# Altium footprint library PcbLib1.PcbLib: 41 footprints (part 1 of 3)
Each footprint in its own frame and in the unit in brackets; x right, y up, seen from the top. Pads: shape width x height; smd on the part's side, far side on the other; paste and mask are expansions set on the pad; w line width, h text height; cw(c..) or ccw(c..) is an arc to the next point about the centre after c.
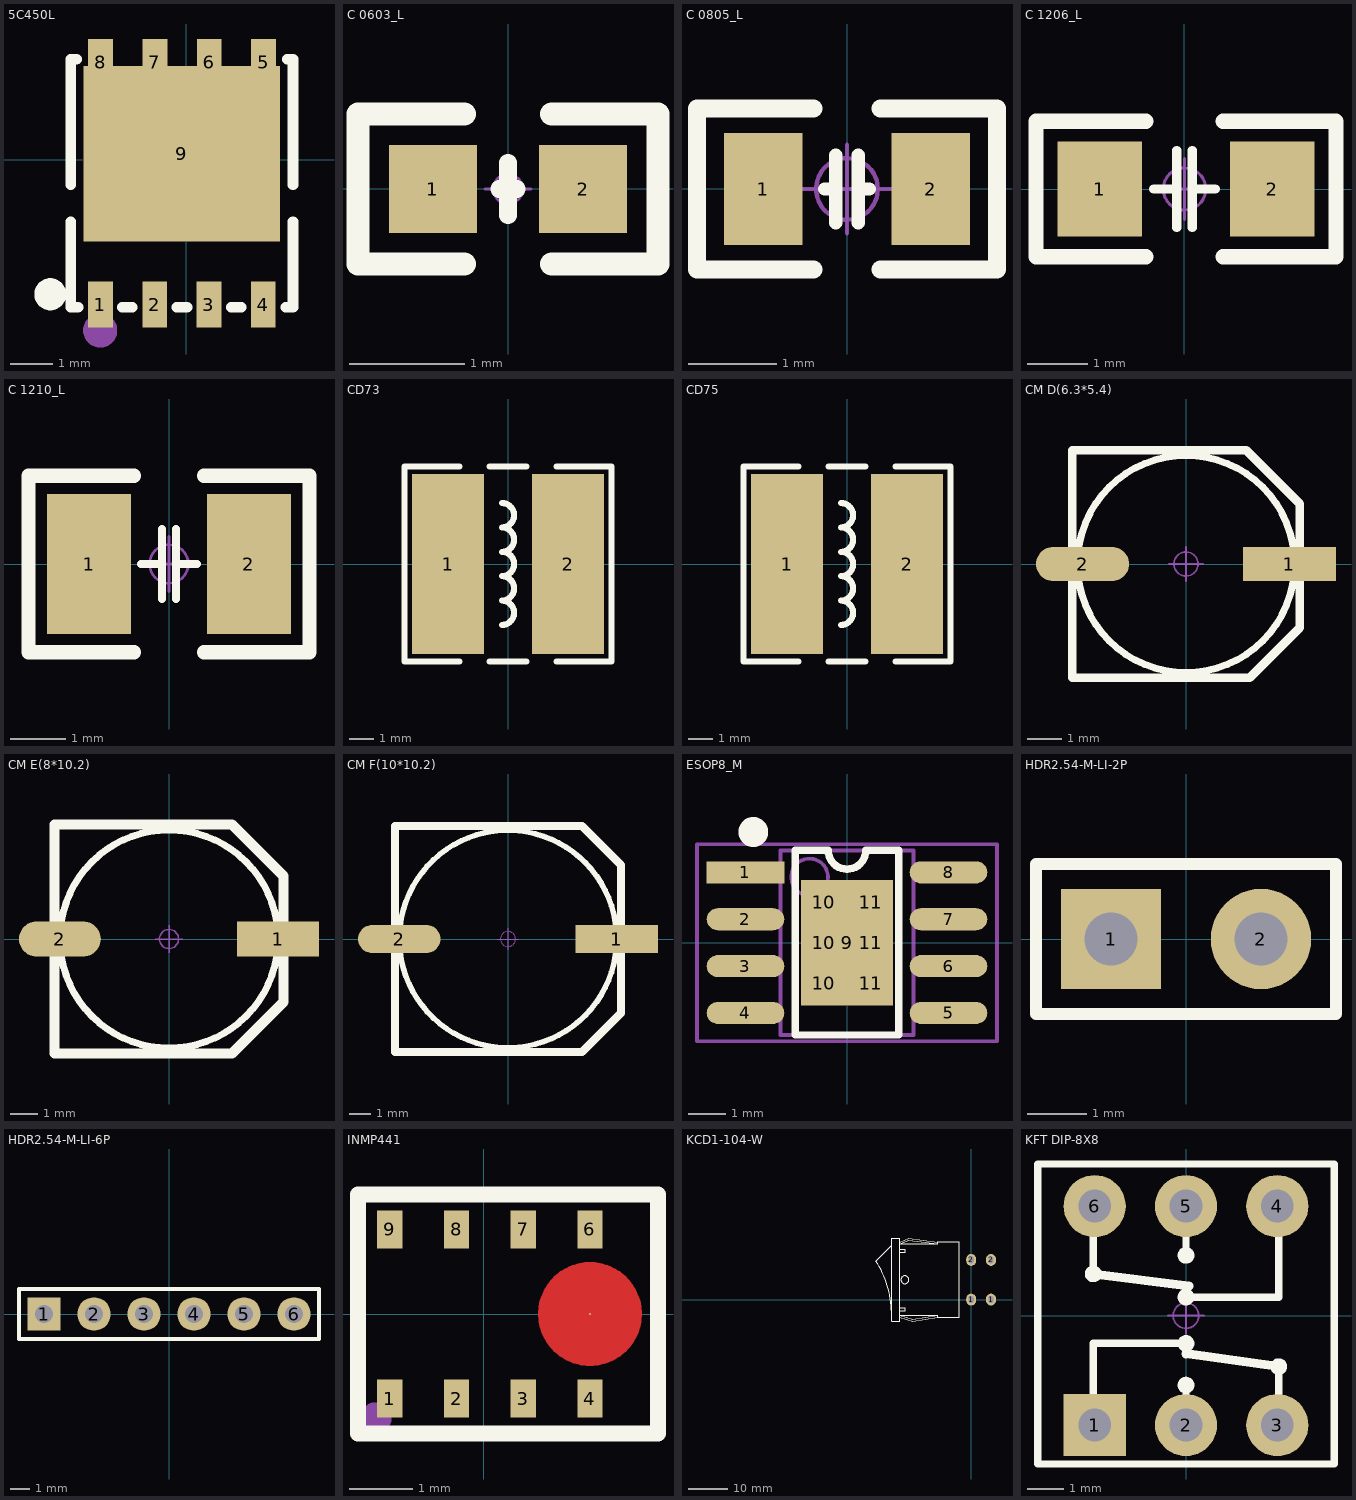
[diagram p0: the footprints below, top view; thin cyan lines are the x and y axes]

## 5C450L [mm]
pads (9):
  rect 0.58x1.079 smd paste-100 mask+0.05: 1(-2.007,-3.386) 2(-0.737,-3.386) 3(0.533,-3.386) 4(1.803,-3.386)
  rect 0.58x1.08 smd paste-100 mask+0.05: 5(1.808,2.283) 6(0.538,2.283) 7(-0.732,2.283) 8(-2.002,2.283)
  rect 4.6x4.1 smd paste-100 mask+0.05: 9(-0.102,0.144)
Top Overlay:
  lines w0.25: -2.702,-1.448 -2.702,-3.446 -2.531,-3.446 ; -2.702,-0.584 -2.702,2.354 -2.565,2.354 -2.602,2.354 ; -1.493,-3.446 -1.261,-3.446 ; -0.223,-3.446 0.019,-3.446 ; 1.057,-3.446 1.289,-3.446 ; 2.327,-3.446 2.498,-3.446 2.498,-1.448 ; 2.398,2.354 2.361,2.354 2.498,2.354 2.498,-0.584
  lines w0.5: -3.302,-3.146 ccw(c-3.178,-3.145) -3.302,-3.144
Top Paste:
  region: -2.302,-2.841 -1.712,-2.841 -1.712,-3.931 -2.302,-3.931
  region: -1.032,-2.841 -0.442,-2.841 -0.442,-3.931 -1.032,-3.931
  region: 0.238,-2.841 0.828,-2.841 0.828,-3.931 0.238,-3.931
  region: 1.508,-2.841 2.098,-2.841 2.098,-3.931 1.508,-3.931
  region: -2.292,2.823 -1.713,2.823 -1.713,2.193 -1.023,2.193 -1.023,2.823 -0.443,2.823 -0.443,2.193 0.248,2.193 0.248,2.824 0.828,2.824 0.828,2.194 1.518,2.194 1.518,2.823 1.519,2.824 2.097,2.824 2.097,2.194 2.197,2.194 2.197,-1.906 -2.402,-1.906 -2.402,2.194 -2.293,2.194
Mechanical 15:
  circle w0.4: c-2.012,-3.991 r0.2

## C 0603_L [mil] "无极性贴片电容"
pads (2):
  rect 30x30 smd: 1(-25.59,0) 2(25.59,0)
Top Overlay:
  lines w6: -3,0 0,0 3,0 ; 0,-9 0,9
  lines w8: -15,-25.59 -51.18,-25.59 -51.18,25.59 -15,25.59 ; 15,-25.59 51.18,-25.59 51.18,25.59 15,25.59
Mechanical 15:
  circle w1: c0,0 r5
  lines w1: -7.87,0 7.87,0 ; 0,-7.87 0,7.87
3D body "C 0603.STEP": height 31.89, standoff -0.39, extent -31.5,-16.14 31.5,16.14

## C 0805_L [mil] "无极性贴片电容"
height 19.68
pads (2):
  rect 35x50 smd: 1(-37.4,0) 2(37.4,0)
Top Overlay:
  lines w6: -10,0 -5,0 ; -5,-15 -5,15 ; 5,-15 5,15 ; 5,0 10,0
  lines w8: -15,-36 -66.93,-36 -66.93,36 -15,36 ; 15,-36 66.93,-36 66.93,36 15,36
Mechanical 15:
  circle w1.97: c0,0 r13.78
  circle w1.97: c0,0 r13.78
  lines w1.97: -19.68,0 19.68,0 -19.68,0 ; 0,-19.68 0,19.68 0,-19.68
3D body "C 0805.STEP": height 20.08, standoff -0.39, extent -39.37,-24.02 39.37,24.02

## C 1206_L [mil] "无极性贴片电容"
pads (2):
  rect 55x62 smd: 1(-55.12,0) 2(57.09,0)
Top Overlay:
  lines w6: -20,0 -5,0 ; -5,-25 -5,25 ; 5,-25 5,25 ; 5,0 20,0
  lines w10: -25,-44 -96.46,-44 -96.46,44 -25,44 ; 25,-44 96.46,-44 ; 25,44 96.46,44 ; 98.43,-44 98.43,44
Mechanical 15:
  circle w1.97: c0,0 r13.78
  lines w1.97: -19.68,0 19.68,0 ; 0,-19.68 0,19.68
3D body "C 1206.STEP": height 47.64, standoff -0.39, extent -62.99,-31.89 62.99,31.89

## C 1210_L [mm] "无极性贴片电容"
pads (2):
  rect 1.524x2.54 smd: 1(-1.45,0) 2(1.45,0)
Top Overlay:
  lines w0.152: -0.508,0 -0.127,0 ; -0.127,-0.635 -0.127,0.635 ; 0.127,-0.635 0.127,0.635 ; 0.127,0 0.508,0
  lines w0.254: -0.635,-1.6 -2.55,-1.6 -2.55,1.6 -0.635,1.6 ; 0.635,-1.6 2.55,-1.6 2.55,1.6 0.635,1.6
Mechanical 15:
  circle w0.05: c0,0 r0.35
  lines w0.05: -0.5,0 0.5,0 ; 0,-0.5 0,0.5
3D body "C 1210.STEP": height 1.54, standoff 0.01, extent -1.6,-1.285 1.6,1.285

## CD73 [mm] "7.8*7*3.5mm（长宽高）"
pads (2):
  rect 3x7.5 smd: 1(-2.5,0) 2(2.5,0)
Top Overlay:
  lines w0.254: -2.032,-4.064 -4.318,-4.064 -4.318,4.064 -2.032,4.064 ; -0.762,-4.064 0.762,-4.064 ; -0.762,4.064 0.762,4.064 ; -0.254,-2.54 ccw(c-0.254,-2.032) -0.254,-1.524 ccw(c-0.254,-1.016) -0.254,-0.508 ccw(c-0.254,0) -0.254,0.508 ccw(c-0.254,1.016) -0.254,1.524 ccw(c-0.254,2.032) -0.254,2.54 ; 2.032,-4.064 4.318,-4.064 4.318,4.064 2.032,4.064
3D body "CD73.STEP": height 3.75, standoff 0, extent -3.849,-3.5 3.849,3.5

## CD75 [mm] "7.8*7*5mm（长宽高）"
pads (2):
  rect 3x7.5 smd: 1(-2.5,0) 2(2.5,0)
Top Overlay:
  lines w0.254: -2.032,-4.064 -4.318,-4.064 -4.318,4.064 -2.032,4.064 ; -0.762,-4.064 0.762,-4.064 ; -0.762,4.064 0.762,4.064 ; -0.254,-2.54 ccw(c-0.254,-2.032) -0.254,-1.524 ccw(c-0.254,-1.016) -0.254,-0.508 ccw(c-0.254,0) -0.254,0.508 ccw(c-0.254,1.016) -0.254,1.524 ccw(c-0.254,2.032) -0.254,2.54 ; 2.032,-4.064 4.318,-4.064 4.318,4.064 2.032,4.064
3D body "CD75.STEP": height 5.15, standoff 0, extent -3.849,-3.5 3.849,3.5

## CM D(6.3*5.4) [mm] "贴片电解电容，直径6.3mm，高5.4mm"
height 5.4
pads (2):
  rect 2.7x1 smd: 1(3,0)
  oval 2.7x1 smd: 2(-3,0)
Top Overlay:
  circle w0.2: c0,0 r3.15
  lines w0.254: -3.3,-3.3 1.85,-3.3 3.3,-1.85 3.3,1.75 1.75,3.3 -3.3,3.3 -3.3,-3.3
Mechanical 15:
  circle w0.05: c0,0 r0.35
  lines w0.05: -0.5,0 0.5,0 ; 0,-0.5 0,0.5
3D body "CM D(6.3X5.4).STEP": height 5.4, standoff -0.01, extent -3.5,-3.3 3.5,3.3

## CM E(8*10.2) [mm] "贴片电解电容，直径8mm，高10.2mm"
pads (2):
  rect 3x1.3 smd: 1(4,0)
  oval 3x1.3 smd: 2(-4,0)
Top Overlay:
  circle w0.254: c0,0 r4
  lines w0.381: -4.2,-4.2 2.3,-4.2 4.2,-2.3 4.2,2.3 2.3,4.2 -4.2,4.2 -4.2,-4.2
Mechanical 15:
  circle w0.05: c0,0 r0.35
  lines w0.05: -0.5,0 0.5,0 ; 0,-0.5 0,0.5
3D body "CM E(8X10.2).STEP": height 10.2, standoff -0.01, extent -4.5,-4.15 4.5,4.15

## CM F(10*10.2) [mm] "贴片电解电容，直径10mm，高10.2mm"
pads (2):
  rect 3.8x1.3 smd: 1(5,0)
  oval 3.8x1.3 smd: 2(-5,0)
Top Overlay:
  circle w0.254: c0,0 r5
  lines w0.381: 5.191,-3.413 3.404,-5.2 -5.2,-5.2 -5.2,5.2 3.404,5.2 5.2,3.404 5.2,-3.404
Mechanical 15:
  circle w0.05: c0,0 r0.35
  lines w0.05: -0.5,0 0.5,0 ; 0,-0.5 0,0.5
3D body "CM F(10X10.2).STEP": height 10.2, standoff -0.01, extent -5.8,-5.15 5.8,5.15

## ESOP8_M [mm] "5*6*1.8mm（长宽高）"
height 1.75
pads (15):
  rect 2.1x0.6 smd: 1(-2.75,1.905)
  oval 2.1x0.6 smd: 2(-2.75,0.635) 3(-2.75,-0.635) 4(-2.75,-1.905) 5(2.75,-1.905) 6(2.75,-0.635) 7(2.75,0.635) 8(2.75,1.905)
  rect 2.5x3.4 smd paste-2: 9(0,0)
  rect 0.9x0.7 on Top Paste: 10(-0.625,-1.1) 10(-0.625,0) 10(-0.625,1.1) 11(0.65,-1.1) 11(0.65,0) 11(0.65,1.1)
Top Overlay:
  circle w0.5: c-2.54,3 r0.155
  lines w0.2: -1.397,2.5 -1.397,-2.5 1.397,-2.5 1.397,2.5
  lines w0.203: -1.397,2.5 -0.508,2.5 ccw(c0,2.5) 0,1.992 ccw(c0,2.5) 0.508,2.5 1.397,2.5
Mechanical 13:
  circle w0.1: c-1.016,1.778 r0.5
  lines w0.1: -1.8,-2.5 -1.8,2.5 1.8,2.5 1.8,-2.5 -1.8,-2.5
Mechanical 15:
  circle w0.05: c0,0 r0.35
  lines w0.05: -0.5,0 0.5,0 ; 0,-0.5 0,0.5
  lines w0.1: -4.064,-2.667 -4.064,2.667 4.064,2.667 4.064,-2.667 -4.064,-2.667
3D body "ESOP8.STEP": height 1.53, standoff -0.01, extent -3.003,-2.5 3.003,2.5

## HDR2.54-M-LI-2P [mm] "排母，2脚"
pads (2):
  rect 1.7x1.7 hole 0.9: 1(-1.27,0)
  round 1.7 hole 0.9: 2(1.27,0)
Top Overlay:
  lines w0.2: -2.54,-1.27 -2.54,1.27 2.54,1.27 2.54,-1.27 -2.54,-1.27
3D body "HDR2.54-1P_M.STEP": height 8.5, standoff -3, extent -2.54,-1.27 0,1.27
3D body "HDR2.54-1P_M.STEP": height 8.5, standoff -3, extent 0,-1.27 2.54,1.27

## HDR2.54-M-LI-6P [mm] "排母，6脚"
pads (6):
  rect 1.7x1.7 hole 0.9: 1(-6.35,0)
  round 1.7 hole 0.9: 2(-3.81,0) 3(-1.27,0) 4(1.27,0) 5(3.81,0) 6(6.35,0)
Top Overlay:
  lines w0.2: -7.62,-1.27 -7.62,1.27 7.62,1.27 7.62,-1.27 -7.62,-1.27
3D body "HDR2.54-1P_M.STEP": height 8.5, standoff -3, extent 2.54,-1.27 5.08,1.27
3D body "HDR2.54-1P_M.STEP": height 8.5, standoff -3, extent 0,-1.27 2.54,1.27
3D body "HDR2.54-1P_M.STEP": height 8.5, standoff -3, extent 5.08,-1.27 7.62,1.27
3D body "HDR2.54-1P_M.STEP": height 8.5, standoff -3, extent -5.08,-1.27 -2.54,1.27
3D body "HDR2.54-1P_M.STEP": height 8.5, standoff -3, extent -7.62,-1.27 -5.08,1.27
3D body "HDR2.54-1P_M.STEP": height 8.5, standoff -3, extent -2.54,-1.27 0,1.27

## INMP441 [mm]
pads (9):
  rect 0.4x0.6 smd paste-100 mask+0.05: 1(-1.479,-1.33) 2(-0.429,-1.33) 3(0.621,-1.33) 4(1.671,-1.33) 6(1.671,1.33) 7(0.621,1.33) 8(-0.429,1.33) 9(-1.479,1.33)
  round 0.025 smd: 5(1.671,0)
Top Layer:
  region: 2.484,0.001 2.484,0.002 2.483,0.043 2.48,0.084 2.475,0.125 2.467,0.165 2.458,0.205 2.447,0.245 2.433,0.284 2.418,0.322 2.401,0.36 2.382,0.396 2.361,0.432 2.338,0.466 2.314,0.499 2.288,0.531 2.26,0.562 2.231,0.591 2.2,0.618 2.169,0.644 2.135,0.669 2.101,0.691 2.065,0.712 2.029,0.731 1.992,0.749 1.953,0.764 1.914,0.777 1.875,0.789 1.835,0.798 1.794,0.805 1.753,0.81 1.712,0.814 1.671,0.815 1.63,0.814 1.589,0.81 1.548,0.805 1.507,0.798 1.467,0.789 1.428,0.777 1.389,0.764 1.35,0.749 1.313,0.731 1.276,0.712 1.241,0.691 1.206,0.669 1.173,0.644 1.141,0.618 1.111,0.591 1.082,0.562 1.054,0.531 1.028,0.499 1.004,0.466 0.981,0.432 0.96,0.396 0.941,0.36 0.924,0.322 0.909,0.284 0.895,0.245 0.884,0.205 0.875,0.165 0.867,0.125 0.862,0.084 0.859,0.043 0.858,0.002 0.858,0.001 0.859,-0.038 0.862,-0.079 0.866,-0.119 0.873,-0.159 0.882,-0.199 0.893,-0.238 0.906,-0.277 0.921,-0.315 0.937,-0.352 0.956,-0.388 0.976,-0.423 0.998,-0.458 1.021,-0.491 1.047,-0.523 1.073,-0.553 1.102,-0.582 1.131,-0.61 1.163,-0.636 1.195,-0.661 1.229,-0.684 1.263,-0.705 1.299,-0.725 1.335,-0.743 1.373,-0.758 1.411,-0.772 1.45,-0.784 1.489,-0.794 1.529,-0.803 1.569,-0.809 1.61,-0.813 1.651,-0.815 1.691,-0.815 1.732,-0.813 1.772,-0.809 1.813,-0.803 1.852,-0.794 1.892,-0.784 1.931,-0.772 1.969,-0.758 2.006,-0.743 2.043,-0.725 2.079,-0.705 2.113,-0.684 2.147,-0.661 2.179,-0.636 2.21,-0.61 2.24,-0.582 2.268,-0.553 2.295,-0.523 2.32,-0.491 2.344,-0.458 2.366,-0.423 2.386,-0.388 2.405,-0.352 2.421,-0.315 2.436,-0.277 2.449,-0.238 2.46,-0.199 2.469,-0.159 2.475,-0.119 2.48,-0.079 2.483,-0.038
Top Overlay:
  lines w0.254: -1.979,-1.88 -1.979,1.88 2.741,1.88 2.741,-1.88 -1.979,-1.88
Top Paste:
  region: -1.679,1.63 -1.279,1.63 -1.279,1.03 -1.679,1.03
  region: -0.629,1.63 -0.229,1.63 -0.229,1.03 -0.629,1.03
  region: 0.421,1.63 0.821,1.63 0.821,1.03 0.421,1.03
  region: 1.471,1.63 1.871,1.63 1.871,1.03 1.471,1.03
  region: 1.471,-1.03 1.871,-1.03 1.871,-1.63 1.471,-1.63
  region: 0.421,-1.03 0.821,-1.03 0.821,-1.63 0.421,-1.63
  region: -0.629,-1.03 -0.229,-1.03 -0.229,-1.63 -0.629,-1.63
  region: -1.679,-1.03 -1.279,-1.03 -1.279,-1.63 -1.679,-1.63
  region: 2.166,-0.098 2.476,-0.098 2.46,-0.234 2.341,-0.481 2.148,-0.675 1.902,-0.795 1.766,-0.811 1.666,-0.808 1.576,-0.808 1.44,-0.792 1.195,-0.673 1.002,-0.48 0.882,-0.234 0.866,-0.098 1.166,-0.098 1.186,-0.172 1.258,-0.306 1.366,-0.412 1.502,-0.481 1.576,-0.499 1.666,-0.508 1.756,-0.508 1.831,-0.49 1.968,-0.419 2.076,-0.31 2.147,-0.173
  region: 1.176,0.102 0.866,0.102 0.882,0.237 1.001,0.484 1.194,0.678 1.44,0.798 1.576,0.814 1.676,0.812 1.766,0.812 1.901,0.795 2.147,0.676 2.34,0.483 2.46,0.237 2.476,0.102 2.176,0.102 2.156,0.175 2.084,0.309 1.976,0.416 1.84,0.484 1.766,0.503 1.676,0.512 1.586,0.512 1.511,0.493 1.374,0.422 1.265,0.313 1.195,0.176
Mechanical 15:
  circle w0.25: c-1.699,-1.64 r0.125

## KCD1-104-W [mm] "船型开关-卧式"
pads (4):
  oval 2.5x3 hole 1.2 slot 1.7 at 90 deg mask+0: 1(0,0) 1(5,0) 2(0,10) 2(5,10)
Top Overlay:
  circle w0.1: c-16.7,5 r1
  lines w0.1: -20.041,-3.203 ccw(c-44.537,-3.63) -23.99,9.714 -19.994,13.71 ; -18,-4.5 -14.7,-5.5 -8.4,-4.5 ; -18,-4 -14.7,-5 -8.4,-4 ; -17.985,-4 -8.4,-4 ; -17.984,14.498 -15.684,15.498 -8.4,14.498 ; -17.972,-2.794 -16.575,-2.794 -16.575,-2.007 -17.972,-2.007 ; -17.972,11.862 -16.575,11.862 -16.575,12.649 -17.972,12.649 ; -8.4,13.995 -8.4,14.503 ; -8.4,14.5 -3,14.5 -3,-4.5 -8.4,-4.5 ; -8.4,-4.5 -8.4,-4 ; -20,-5.5 -18,-5.5 -18,15.5 -20,15.5 -20,-5.5 ; -17.984,13.998 -8.4,13.998 -15.684,14.998 -17.984,13.998
3D body "KCD1-104.STEP": height 15.1, standoff -3.35, extent -24.2,-5.951 5.4,15.951

## KFT DIP-8X8 [mm] "自锁开关，规格：8*8mm"
pads (6):
  rect 1.7x1.7 hole 0.9: 1(-2.5,-3)
  round 1.7 hole 0.9: 2(0,-3) 3(2.5,-3) 4(2.5,3) 5(0,3) 6(-2.5,3)
Top Overlay:
  circle w0.254: c0,-0.762 r0.102
  circle w0.254: c0,0.508 r0.102
  circle w0.254: c2.54,-1.397 r0.102
  circle w0.254: c0,-1.905 r0.102
  circle w0.254: c0,1.651 r0.102
  circle w0.254: c-2.54,1.143 r0.102
  lines w0.2: -4.064,-4.064 -4.064,4.153 4.064,4.153 4.064,-4.064 -4.064,-4.064
  lines w0.203: -2.54,-3.048 -2.54,-0.762 0,-0.762 ; -2.54,1.143 -2.54,2.794 ; 0,-3.048 0,-1.771 ; 0,0.508 2.54,0.508 2.54,2.794 ; 0,1.6 0,2.794 ; 2.54,-3.048 2.54,-1.397
  lines w0.254: -2.54,1.143 0.076,0.813 ; 0,-1.041 2.54,-1.397
Mechanical 15:
  circle w0.05: c0,0 r0.35
  lines w0.05: -0.5,0 0.5,0 ; 0,-0.5 0,0.5
3D body "SLSW 8x8.STEP": height 13.1, standoff -3.2, extent -3.949,-3.949 4.051,4.051